# Altium footprint library AD_Lib.PcbLib: 508 footprints (part 25 of 32)
Each footprint in its own frame and in the unit in brackets; x right, y up, seen from the top. Pads: shape width x height; smd on the part's side, far side on the other; paste and mask are expansions set on the pad; w line width, h text height; cw(c..) or ccw(c..) is an arc to the next point about the centre after c.
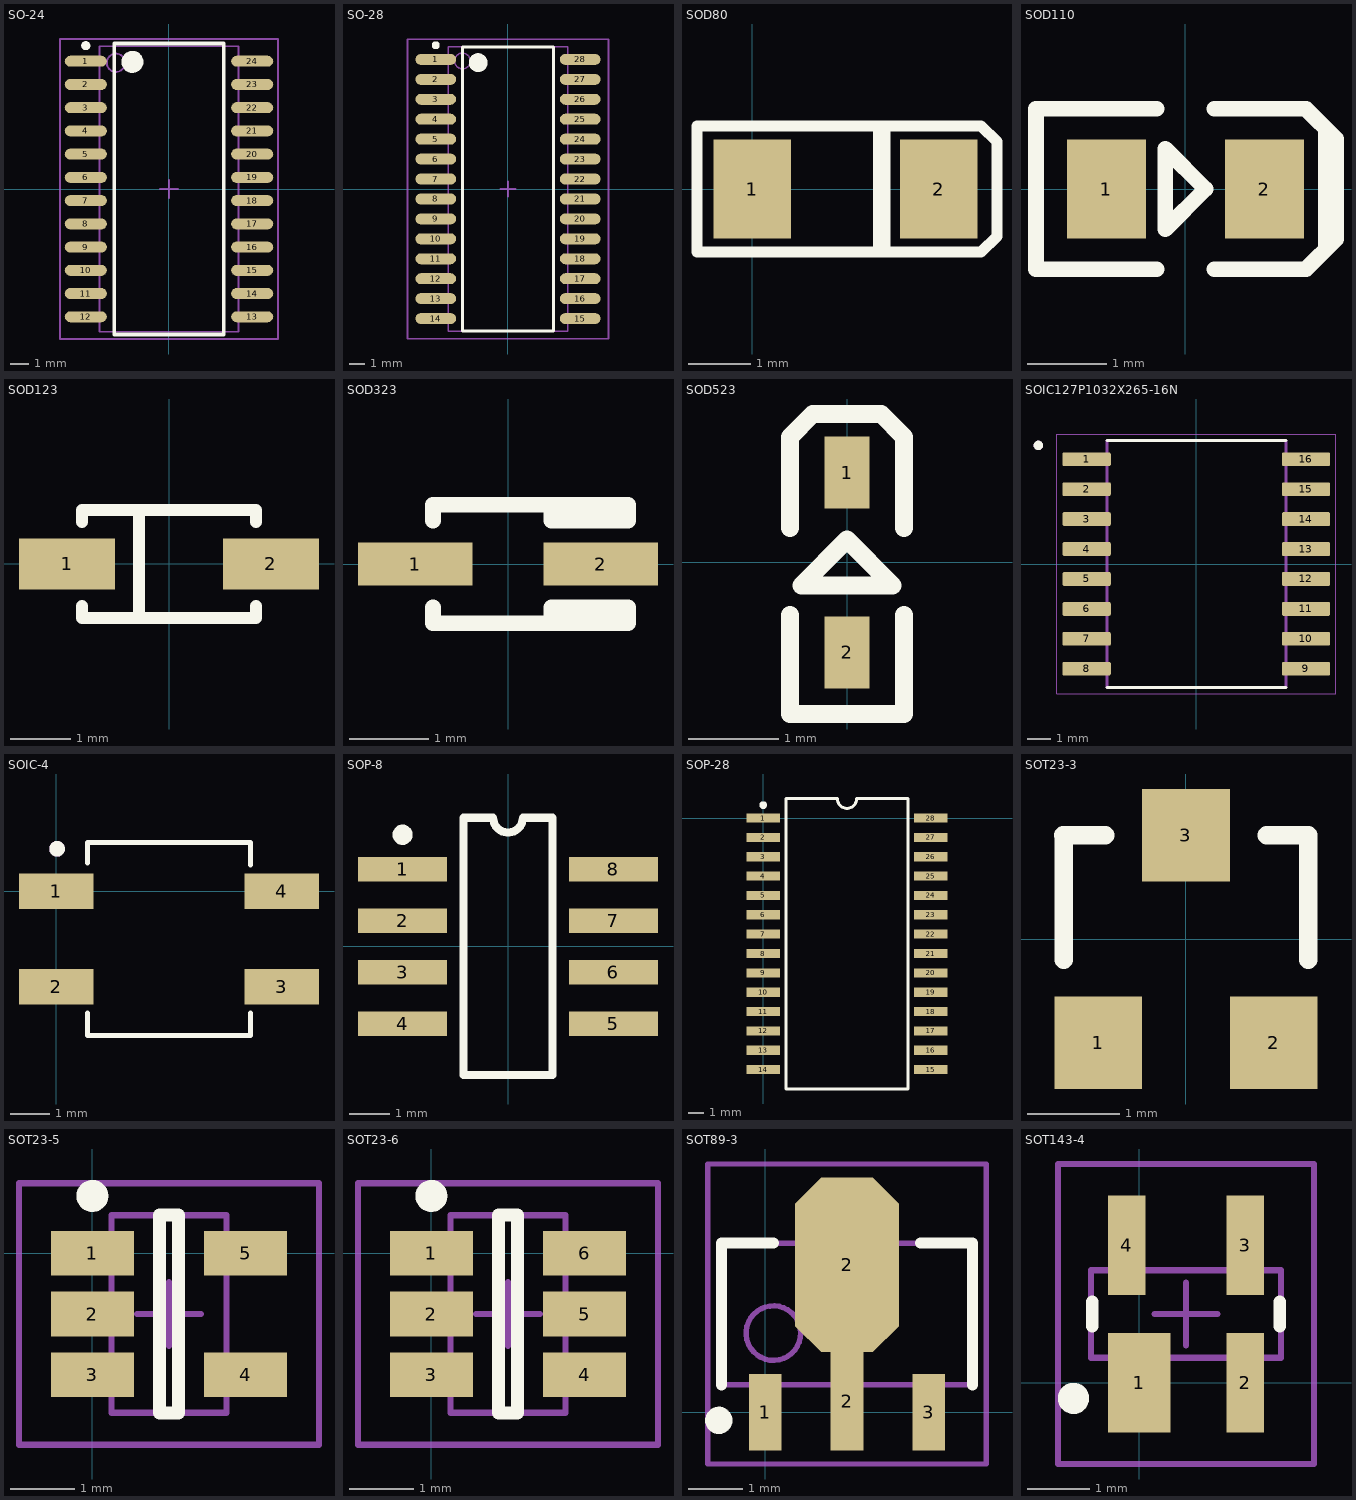
[diagram p24: the footprints below, top view; thin cyan lines are the x and y axes]

## SO-24 [mm] "SOIC, 24-Leads, Body 15.4x7.5mm, Pitch 1.27mm,"
height 2.65
pads (24):
  oval 2.3x0.6 smd: 1(-4.55,6.985) 2(-4.55,5.715) 3(-4.55,4.445) 4(-4.55,3.175) 5(-4.55,1.905) 6(-4.55,0.635) 7(-4.55,-0.635) 8(-4.55,-1.905) 9(-4.55,-3.175) 10(-4.55,-4.445) 11(-4.55,-5.715) 12(-4.55,-6.985) 13(4.55,-6.985) 14(4.55,-5.715) 15(4.55,-4.445) 16(4.55,-3.175) 17(4.55,-1.905) 18(4.55,-0.635) 19(4.55,0.635) 20(4.55,1.905) 21(4.55,3.175) 22(4.55,4.445) 23(4.55,5.715) 24(4.55,6.985)
Top Overlay:
  circle w0.6: c-2,6.95 r0.3
  circle w0.25: c-4.55,7.835 r0.125
  lines w0.2: -3,-7.95 3,-7.95 3,7.95 -3,7.95 -3,-7.95
Mechanical 13:
  circle w0.1: c-2.9,6.9 r0.5
  lines w0.1: -3.8,-7.8 3.8,-7.8 3.8,7.8 -3.8,7.8 -3.8,-7.8
Mechanical 15:
  lines w0.1: -0.5,0 0.5,0 ; 0,-0.5 0,0.5 ; -5.95,-8.2 5.95,-8.2 5.95,8.2 -5.95,8.2 -5.95,-8.2
3D body: height 2.65, standoff 0, extent -3.8,-7.8 3.8,7.8

## SO-28 [mm] "SOIC, 28-Leads, Body 17.9x7.5mm, Pitch 1.27mm, IPC Low Density"
height 2.65
pads (28):
  oval 2.6x0.7 smd: 1(-4.6,8.255) 2(-4.6,6.985) 3(-4.6,5.715) 4(-4.6,4.445) 5(-4.6,3.175) 6(-4.6,1.905) 7(-4.6,0.635) 8(-4.6,-0.635) 9(-4.6,-1.905) 10(-4.6,-3.175) 11(-4.6,-4.445) 12(-4.6,-5.715) 13(-4.6,-6.985) 14(-4.6,-8.255) 15(4.6,-8.255) 16(4.6,-6.985) 17(4.6,-5.715) 18(4.6,-4.445) 19(4.6,-3.175) 20(4.6,-1.905) 21(4.6,-0.635) 22(4.6,0.635) 23(4.6,1.905) 24(4.6,3.175) 25(4.6,4.445) 26(4.6,5.715) 27(4.6,6.985) 28(4.6,8.255)
Top Overlay:
  circle w0.25: c-4.6,9.155 r0.125
  circle w0.6: c-1.9,8.05 r0.3
  lines w0.2: -2.9,-9.05 -2.9,9.05 2.9,9.05 2.9,-9.05 -2.9,-9.05
Mechanical 13:
  circle w0.1: c-2.9,8.155 r0.5
  lines w0.1: -3.8,-9.055 -3.8,9.055 3.8,9.055 3.8,-9.055 -3.8,-9.055
Mechanical 15:
  lines w0.1: -0.5,0 0.5,0 ; 0,-0.5 0,0.5 ; -6.4,-9.55 -6.4,9.55 6.4,9.55 6.4,-9.55 -6.4,-9.55
3D body: height 2.65, standoff 0, extent -3.8,-9.055 3.8,9.055

## SOD80 [mm] "Metal Electrode Face (MELF) Diode; Body 3.5 x 1.6 mm (LxDia)"
height 1.6
pads (2):
  rect 1.25x1.6 smd: 1(0,0) 2(3,0)
Top Overlay:
  lines w0.178: 2.032,-1.016 2.032,1.016 ; 2.135,-1.016 2.135,1.016 ; -0.889,-1.016 3.683,-1.016 3.937,-0.762 3.937,0.762 3.683,1.016 -0.889,1.016 -0.889,-1.016

## SOD110 [mm] "SOD-110; 2 Leads; Body 3 x 1.25 mm, (LxW)"
height 1.1
pads (2):
  rect 1x1.25 smd: 1(-1,0) 2(1,0)
Top Overlay:
  lines w0.2: -0.365,-1.016 -1.889,-1.016 -1.889,1.016 -0.365,1.016 ; 0.365,-1.016 1.524,-1.016 1.905,-0.635 1.905,0.635 1.524,1.016 0.365,1.016 ; 1.778,-0.762 1.778,0.762 ; -0.254,-0.508 0.254,0 -0.254,0.508 -0.254,-0.508

## SOD123 [mm] "SOD-123; 2 Leads; Body 2.7 x 1.6 mm, (LxW)"
height 1.35
pads (2):
  rect 1.6x0.85 smd: 1(-1.7,0) 2(1.7,0)
Top Overlay:
  lines w0.2: -1.45,-0.7 -1.45,-0.9 1.45,-0.9 1.45,-0.7 ; -1.45,0.7 -1.45,0.9 1.45,0.9 1.45,0.7 ; -0.5,-0.9 -0.5,0.9

## SOD323 [mm] "SOD-323/SC-76; 2 Leads; Body 1.7 x 1.3 mm, (LxW)"
height 1.1
pads (2):
  rect 1.45x0.55 smd: 1(-1.175,0) 2(1.175,0)
Top Overlay:
  lines w0.2: -0.95,-0.55 -0.95,-0.75 1.524,-0.75 1.524,-0.55 0.55,-0.55 0.55,-0.75 ; -0.95,0.55 -0.95,0.75 1.524,0.75 1.524,0.55 0.55,0.55 0.55,0.75

## SOD523 [mm] "SOD-523; 2 Leads; Body 1.2x 0.8 mm, (LxW)"
pads (2):
  rect 0.5x0.8 smd: 1(0,1) 2(0,-1)
Top Overlay:
  lines w0.2: -0.635,-0.584 -0.635,-1.686 0.635,-1.686 0.635,-0.584 ; -0.635,0.381 -0.635,1.397 -0.381,1.651 0.381,1.651 0.635,1.397 0.635,0.381 ; -0.508,-0.254 0.508,-0.254 0,0.254 -0.508,-0.254

## SOIC127P1032X265-16N [mm]
pads (16):
  rrect25% 2.05x0.59 smd: 1(-4.655,4.445) 2(-4.655,3.175) 3(-4.655,1.905) 4(-4.655,0.635) 5(-4.655,-0.635) 6(-4.655,-1.905) 7(-4.655,-3.175) 8(-4.655,-4.445) 9(4.655,-4.445) 10(4.655,-3.175) 11(4.655,-1.905) 12(4.655,-0.635) 13(4.655,0.635) 14(4.655,1.905) 15(4.655,3.175) 16(4.655,4.445)
Top Overlay:
  circle w0.2: c-6.705,5.035 r0.1
  lines w0.127: -3.8,-5.25 3.8,-5.25 ; -3.8,5.25 3.8,5.25
Mechanical 13:
  circle w0.2: c-6.705,5.035 r0.1
  lines w0.127: -3.8,-5.25 -3.8,5.25 3.8,5.25 3.8,-5.25 -3.8,-5.25
Mechanical 15:
  lines w0.05: -5.93,-5.5 -5.93,5.5 5.93,5.5 5.93,-5.5 -5.93,-5.5

## SOIC-4 [mm] "SOIC-4, 如MB107S"
height 2.9
pads (4):
  rect 1.91x0.91 smd: 1(0,0) 2(0,-2.45) 3(5.8,-2.45) 4(5.8,0)
Top Overlay:
  circle w0.2: c0.025,1.092 r0.1
  lines w0.127: 0.8,-3.125 0.8,-3.705 5,-3.705 5,-3.125 ; 0.8,0.725 0.8,1.255 5,1.255 5,0.675
Mechanical 4:
  circle w0.2: c0.025,1.092 r0.1
  circle w0.2: c0.025,1.092 r0.1

## SOP-8 [mm] "Small Outline; 8 Leads; Body Width 4.3 mm; Pitc"
height 1.5
pads (8):
  rect 2.2x0.6 smd: 1(-2.6,1.905) 2(-2.6,0.635) 3(-2.6,-0.635) 4(-2.6,-1.905) 5(2.6,-1.905) 6(2.6,-0.635) 7(2.6,0.635) 8(2.6,1.905)
Top Overlay:
  circle w0.25: c-2.6,2.755 r0.125
  lines w0.2: -1.1,-3.175 -1.1,3.175 -0.367,3.175 ccw(c0,3.175) 0.367,3.175 1.1,3.175 1.1,-3.175 -1.1,-3.175

## SOP-28 [mm] "Small Outline; 28 Leads; Body Width 9.1 mm; Pitch 1.27 mm"
height 3
pads (28):
  rect 2.2x0.6 smd: 1(0,0) 2(0,-1.27) 3(0,-2.54) 4(0,-3.81) 5(0,-5.08) 6(0,-6.35) 7(0,-7.62) 8(0,-8.89) 9(0,-10.16) 10(0,-11.43) 11(0,-12.7) 12(0,-13.97) 13(0,-15.24) 14(0,-16.51) 15(11,-16.51) 16(11,-15.24) 17(11,-13.97) 18(11,-12.7) 19(11,-11.43) 20(11,-10.16) 21(11,-8.89) 22(11,-7.62) 23(11,-6.35) 24(11,-5.08) 25(11,-3.81) 26(11,-2.54) 27(11,-1.27) 28(11,0)
Top Overlay:
  circle w0.25: c0,0.85 r0.125
  lines w0.2: 1.5,-17.78 1.5,1.27 4.865,1.27 ccw(c5.5,1.27) 6.135,1.27 9.5,1.27 9.5,-17.78 1.5,-17.78

## SOT23-3 [mm] "SOT-23; 3 Leads; Body 3.0 x 2.5 mm, inc. leads (LxW max)"
height 1.2
pads (3):
  rect 0.95x1 smd: 1(-0.95,-1.125) 2(0.95,-1.125) 3(0,1.125)
Top Overlay:
  lines w0.2: -1.328,1.125 -0.875,1.125 ; -1.325,-0.225 -1.325,1.125 ; 0.875,1.125 1.325,1.125 1.325,-0.225

## SOT23-5 [mm] "SOT23, 5-Leads, Body 2.9x1.6mm, Pitch 0.95mm, Lead Span 2.7mm, IPC Low Density"
height 1.45
pads (5):
  rect 1.3x0.7 smd: 1(0,0) 2(0,-0.95) 3(0,-1.9) 4(2.4,-1.9) 5(2.4,0)
Top Overlay:
  circle w0.25: c0,0.9 r0.125
  lines w0.2: 1.05,-2.5 1.35,-2.5 1.35,0.6 1.05,0.6 1.05,-2.5
Mechanical 13:
  lines w0.1: 0.3,-2.5 0.3,0.6 2.1,0.6 2.1,-2.5 0.3,-2.5
Mechanical 15:
  lines w0.1: 0.7,-0.95 1.7,-0.95 ; 1.2,-1.45 1.2,-0.45 ; -1.15,-3 -1.15,1.1 3.55,1.1 3.55,-3 -1.15,-3
3D body: height 1.45, standoff 0, extent 0.3,-2.5 2.1,0.6

## SOT23-6 [mm] "SOT23, 6-Leads, Body 2.9x1.6mm, Pitch 0.95mm, Lead Span 2.7mm, IPC Low Density"
height 1.45
pads (6):
  rect 1.3x0.7 smd: 1(0,0) 2(0,-0.95) 3(0,-1.9) 4(2.4,-1.9) 5(2.4,-0.95) 6(2.4,0)
Top Overlay:
  circle w0.25: c0,0.9 r0.125
  lines w0.2: 1.05,-2.5 1.05,0.6 1.35,0.6 1.35,-2.5 1.05,-2.5
Mechanical 13:
  lines w0.1: 0.3,-2.5 2.1,-2.5 2.1,0.6 0.3,0.6 0.3,-2.5
Mechanical 15:
  lines w0.1: 0.7,-0.95 1.7,-0.95 ; 1.2,-1.45 1.2,-0.45 ; -1.15,-3 3.55,-3 3.55,1.1 -1.15,1.1 -1.15,-3
3D body: height 1.45, standoff 0, extent 0.3,-2.5 2.1,0.6

## SOT89-3 [mm] "TO-243AA, 3-Leads, Body 4.5x2.4 mm, Pitch 1.5mm, Lead Span 4.1mm, IPC Medium Density"
height 1.6
pads (4):
  rect 0.6x1.4 smd: 1(0,0) 3(3,0)
  rect 0.6x1.8 smd: 2(1.5,0.2)
  oct 1.9x3.2 smd: 2(1.5,2.7)
Top Overlay:
  circle w0.25: c-0.85,-0.15 r0.125
  lines w0.2: -0.8,0.5 -0.8,3.1 0.15,3.1 ; 2.85,3.1 3.8,3.1 3.8,0.5
Mechanical 13:
  circle w0.1: c0.15,1.45 r0.5
  lines w0.1: -0.8,0.5 3.8,0.5 3.8,3.1 -0.8,3.1 -0.8,0.5
Mechanical 15:
  lines w0.1: 1,1.8 2,1.8 ; 1.5,1.3 1.5,2.3 ; -1.05,-0.95 4.05,-0.95 4.05,4.55 -1.05,4.55 -1.05,-0.95
3D body: height 1.6, standoff 0, extent -0.8,0.5 3.8,3.1

## SOT143-4 [mm] "SOT143, 4-Leads, Body 2.9x1.3mm, Pitch 1.9mm, Lead Span 2.4mm, IPC Low Density"
height 1.22
pads (4):
  rect 1x1.6 smd: 1(0,0)
  rect 0.6x1.6 smd: 2(1.7,0) 3(1.7,2.2) 4(-0.2,2.2)
Top Overlay:
  circle w0.25: c-1.05,-0.25 r0.125
  lines w0.2: -0.75,0.9 -0.75,1.3 ; 2.25,0.9 2.25,1.3
Mechanical 13:
  lines w0.1: -0.77,0.4 2.27,0.4 2.27,1.8 -0.77,1.8 -0.77,0.4
Mechanical 15:
  lines w0.1: 0.25,1.1 1.25,1.1 ; 0.75,0.6 0.75,1.6 ; -1.3,-1.3 2.8,-1.3 2.8,3.5 -1.3,3.5 -1.3,-1.3
3D body: height 1.22, standoff 0, extent -0.77,0.4 2.27,1.8